# Altium footprint library sun_library.PcbLib: 412 footprints (part 23 of 26)
Each footprint in its own frame and in the unit in brackets; x right, y up, seen from the top. Pads: shape width x height; smd on the part's side, far side on the other; paste and mask are expansions set on the pad; w line width, h text height; cw(c..) or ccw(c..) is an arc to the next point about the centre after c.
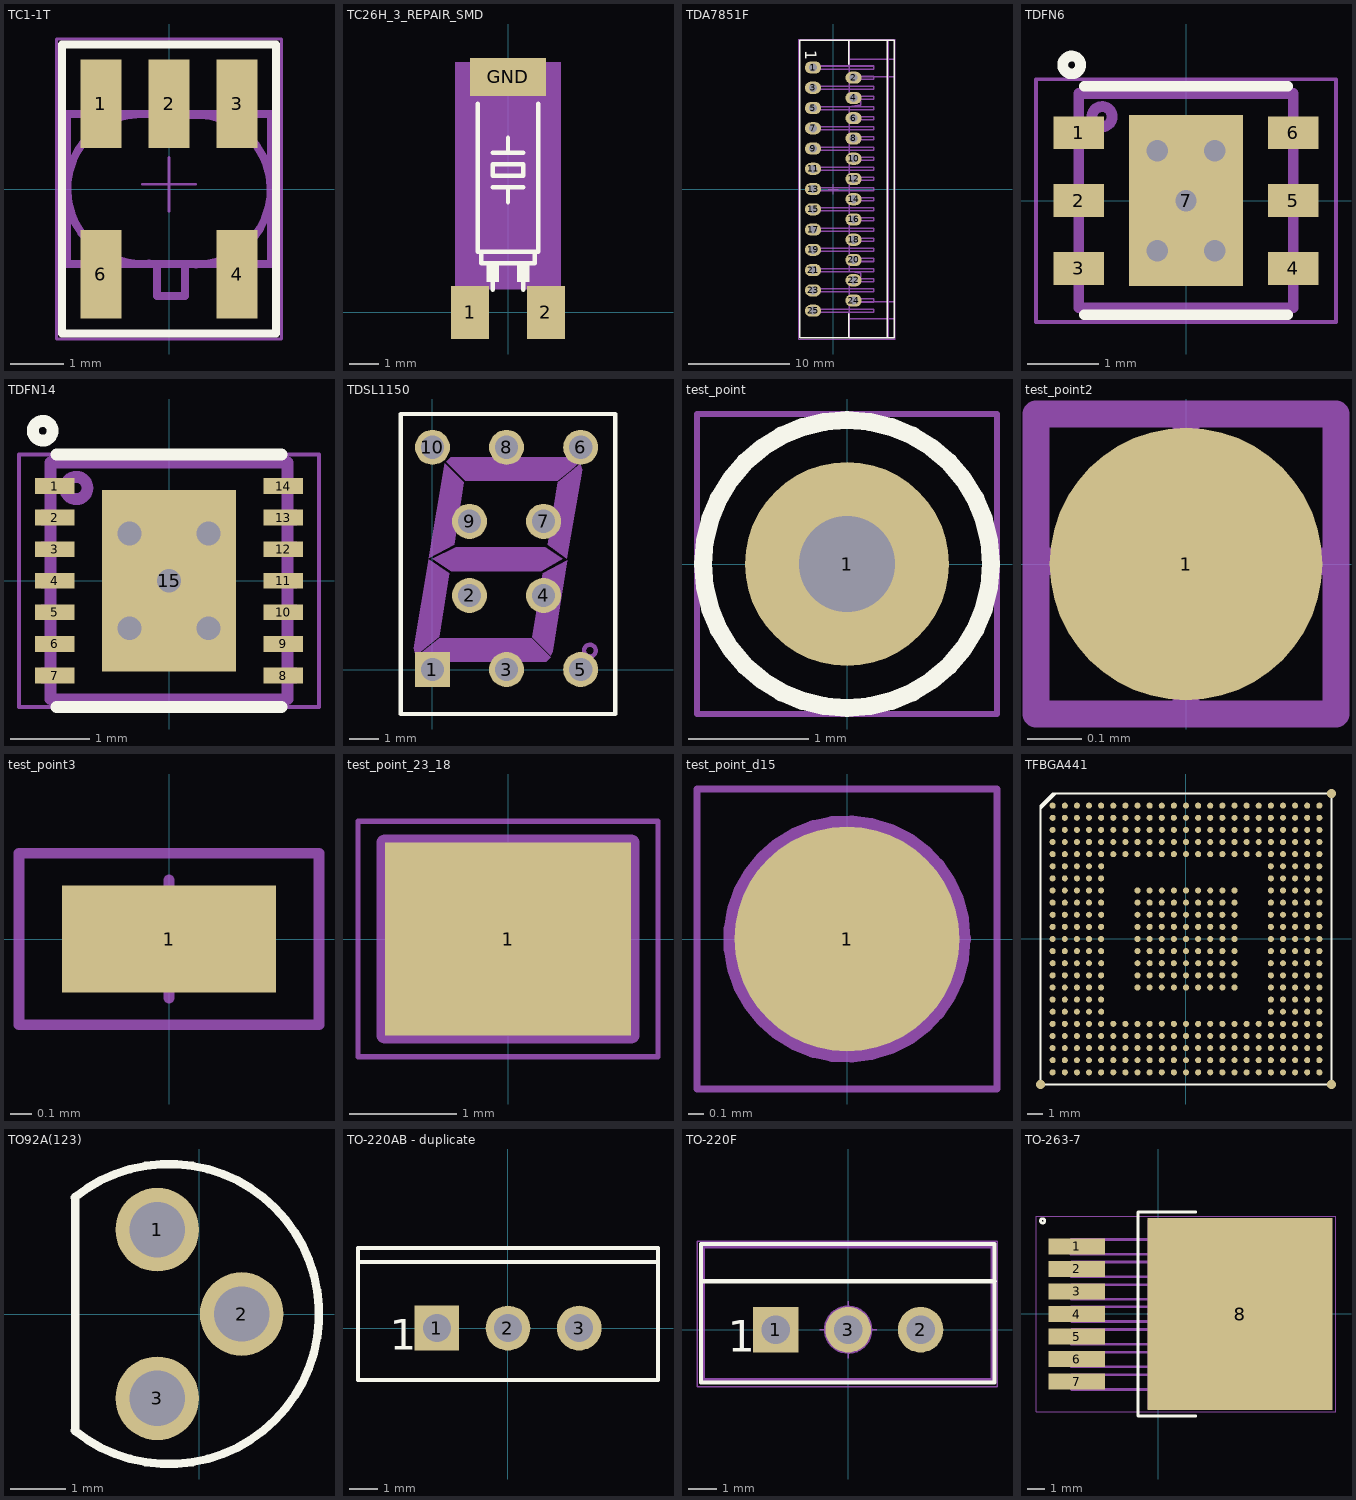
[diagram p22: the footprints below, top view; thin cyan lines are the x and y axes]

## TC1-1T [mm] "TC1-1T RF Transformer From MINI-CIRCUITS"
height 1.35
pads (5):
  rect 0.76x1.65 smd: 1(-1.27,1.59) 2(0,1.59) 3(1.27,1.59) 4(1.27,-1.59) 6(-1.27,-1.59)
Top Overlay:
  lines w0.15: -2,-2.7 2,-2.7 2,2.7 -2,2.7 -2,-2.7
TopAssy 13:
  lines w0.15: -0.5,1.4 ccw(c-0.5,0) -0.373,-1.394 ; -0.2,-1.4 0.325,-1.4 ; 0.373,1.382 cw(c0.5,-0.012) 0.5,-1.412 ; 1.9,-0.012 1.9,0.288 ; -0.3,1.4 -0.3,2 0.225,2 0.225,1.4 ; -0.3,1.4 -0.975,1.4 -0.975,2 -1.5,2 -1.5,1.4 -1.9,1.4 -1.9,-1.4 -1.525,-1.4 -1.525,-2 -1,-2 -1,-1.4 -0.225,-1.4 -0.225,-2 0.3,-2 0.3,-1.4 0.975,-1.4 0.975,-2 1.5,-2 1.5,-1.4 1.9,-1.4 1.9,1.4 1.525,1.4 1.525,2 1,2 1,1.4 0.225,1.4 ; -0.3,1.4 0.225,1.4
CourtTop 15:
  lines w0.05: -0.5,0.087 0.5,0.087 ; 0,-0.413 0,0.587 ; -2.1,-2.8 -2.1,2.8 2.1,2.8 2.1,-2.8 -2.1,-2.8
3D body "User Library-etc1-1-13.step": height 2.55, standoff -0.05, extent -1.91,-2.413 1.9,2.413

## TC26H_3_REPAIR_SMD [mil]
pads (3):
  rect 50x70 smd: 1(-50,0) 2(50,0)
  rect 100x50 smd: GND(0,310)
Top Overlay:
  rectangle: -28,40 -12,63
  rectangle: 12,40 28,63
  lines w5.91: -40,275 -40,80 -35,80 ; -20,30 -20,50 ; -20,165 0,165 ; -20,210 0,210 ; 0,145 0,165 ; 0,230 0,210 ; 20,30 20,45 ; 20,165 0,165 ; 20,210 0,210 ; 40,275 40,80 35,80 ; -35,80 35,80 ; -35,80 -35,65 35,65 35,80 ; -20,180 20,180 20,195 -20,195 -20,180
Mechanical 11:
  rectangle: -70,30 70,330

## TDA7851F [mm] "TO, Thru-Hole, 4 x 48 W MOSFET quad bridge power amplifier"
height 22
pads (25):
  oval 1.6x1.2 hole 0.8: 1(-2,12) 2(2,11) 3(-2,10) 4(2,9) 5(-2,8) 6(2,7) 7(-2,6) 8(2,5) 9(-2,4) 10(2,3) 11(-2,2) 12(2,1) 13(-2,0) 14(2,-1) 15(-2,-2) 16(2,-3) 17(-2,-4) 18(2,-5) 19(-2,-6) 20(2,-7) 21(-2,-8) 22(2,-9) 23(-2,-10) 24(2,-11) 25(-2,-12)
Top Overlay:
  lines w0.15: 1.5,-14.7 1.5,-12.3 ; 1.5,12.3 1.5,14.7 ; 5.3,-14.7 5.3,14.7 ; -3.3,-14.7 -3.3,14.7 6,14.7 6,-14.7 -3.3,-14.7
  text "1" at -2.775,13.715 h1.1
TopAssy 13:
  lines w0.15: -1.5,-12.15 -1.5,-11.85 ; -1.5,-10.15 -1.5,-9.85 ; -1.5,-8.15 -1.5,-7.85 ; -1.5,-6.15 -1.5,-5.85 ; -1.5,-4.15 -1.5,-3.85 ; -1.5,-2.15 -1.5,-1.85 ; -1.5,-0.15 -1.5,0.15 ; -1.5,1.85 -1.5,2.15 ; -1.5,3.85 -1.5,4.15 ; -1.5,5.85 -1.5,6.15 ; -1.5,7.85 -1.5,8.15 ; -1.5,9.85 -1.5,10.15 ; -1.5,11.85 -1.5,12.15 ; 1.55,-12.8 6.05,-12.8 ; 1.55,-11.1 6.05,-11.1 ; 1.55,11.1 6.05,11.1 ; 1.55,12.8 6.05,12.8 ; 2.5,-11.15 2.5,-10.85 ; 2.5,-9.15 2.5,-8.85 ; 2.5,-7.15 2.5,-6.85 ; 2.5,-5.15 2.5,-4.85 ; 2.5,-3.15 2.5,-2.85 ; 2.5,-1.15 2.5,-0.85 ; 2.5,0.85 2.5,1.15 ; 2.5,2.85 2.5,3.15 ; 2.5,4.85 2.5,5.15 ; 2.5,6.85 2.5,7.15 ; 2.5,8.85 2.5,9.15 ; 2.5,10.85 2.5,11.15 ; 5.4,-14.7 5.4,14.7 ; -2,-12.15 -2,-11.85 4,-11.85 4,-12.15 -2,-12.15 ; -2,-10.15 -2,-9.85 4,-9.85 4,-10.15 -2,-10.15 ; -2,-8.15 -2,-7.85 4,-7.85 4,-8.15 -2,-8.15 ; -2,-6.15 -2,-5.85 4,-5.85 4,-6.15 -2,-6.15 ; -2,-4.15 -2,-3.85 4,-3.85 4,-4.15 -2,-4.15 ; -2,-2.15 -2,-1.85 4,-1.85 4,-2.15 -2,-2.15 ; -2,-0.15 -2,0.15 4,0.15 4,-0.15 -2,-0.15 ; -2,1.85 -2,2.15 4,2.15 4,1.85 -2,1.85 ; -2,3.85 -2,4.15 4,4.15 4,3.85 -2,3.85 ; -2,5.85 -2,6.15 4,6.15 4,5.85 -2,5.85 ; -2,7.85 -2,8.15 4,8.15 4,7.85 -2,7.85 ; -2,9.85 -2,10.15 4,10.15 4,9.85 -2,9.85 ; -2,11.85 -2,12.15 4,12.15 4,11.85 -2,11.85 ; 1.55,-14.7 1.55,-8.864 2.7,-8.7 2.7,-8.3 1.55,-8.136 1.55,8.136 2.7,8.3 2.7,8.7 1.55,8.864 1.55,14.7 6.05,14.7 6.05,-14.7 1.55,-14.7 ; 2,-11.15 2,-10.85 4,-10.85 4,-11.15 2,-11.15 ; 2,-9.15 2,-8.85 4,-8.85 4,-9.15 2,-9.15 ; 2,-7.15 2,-6.85 4,-6.85 4,-7.15 2,-7.15 ; 2,-5.15 2,-4.85 4,-4.85 4,-5.15 2,-5.15 ; 2,-3.15 2,-2.85 4,-2.85 4,-3.15 2,-3.15 ; 2,-1.15 2,-0.85 4,-0.85 4,-1.15 2,-1.15 ; 2,0.85 2,1.15 4,1.15 4,0.85 2,0.85 ; 2,2.85 2,3.15 4,3.15 4,2.85 2,2.85 ; 2,4.85 2,5.15 4,5.15 4,4.85 2,4.85 ; 2,6.85 2,7.15 4,7.15 4,6.85 2,6.85 ; 2,8.85 2,9.15 4,9.15 4,8.85 2,8.85 ; 2,10.85 2,11.15 4,11.15 4,10.85 2,10.85
  text "1" at -2.775,13.715 h1.1
CourtTop 15:
  lines w0.05: -0.5,0 0.5,0 ; 0,-0.5 0,0.5 ; -3.4,-14.8 -3.4,14.8 6.1,14.8 6.1,-14.8 -3.4,-14.8
3D body "User Library-TDA7850-2.step": height 19.7, standoff -2.77, extent -2.195,-14.615 6,14.615

## TDFN6 [mm] "6-Pin Plastic Dual 3x3 Flat No-Lead 0.95 mm Pitch, IPC Low Density"
height 0.8
pads (7):
  rect 0.71x0.46 smd mask+0.075: 1(-1.5,0.95) 2(-1.5,0) 3(-1.5,-0.95) 4(1.5,-0.95) 5(1.5,0) 6(1.5,0.95)
  rect 1.6x2.39 smd paste-1 mask+0.075: 7(0,0)
via -0.4,-0.7 diameter 0.6 hole 0.3
via 0.4,-0.7 diameter 0.6 hole 0.3
via 0,0 diameter 0.6 hole 0.3
via -0.4,0.7 diameter 0.6 hole 0.3
via 0.4,0.7 diameter 0.6 hole 0.3
Top Overlay:
  circle w0.15: c-1.6,1.9 r0.125
  lines w0.15: -1.425,-1.6 1.425,-1.6 ; -1.425,1.6 1.425,1.6
Top Paste:
  rectangle: -0.325,0.5 0.3,1.125
  rectangle: -0.8,-0.3 -0.175,0.325
  rectangle: -0.3,-1.075 0.325,-0.45
  rectangle: 0.2,-0.325 0.825,0.3
Bottom Solder:
  rectangle: -0.9,-1.3 0.9,1.3
TopAssy 13:
  circle w0.15: c-1.175,1.175 r0.141
  lines w0.15: -1.6,-1.07 -1.6,-0.83 ; -1.6,-0.12 -1.6,0.12 ; -1.6,0.83 -1.6,1.07 ; 1.6,-1.07 1.6,-0.83 ; 1.6,-0.12 1.6,0.12 ; 1.6,0.83 1.6,1.07 ; -1.5,-1.5 1.5,-1.5 1.5,1.5 -1.5,1.5 -1.5,-1.5
CourtTop 15:
  lines w0.05: -0.5,0 0.5,0 ; 0,-0.5 0,-0.25 0,0.25 0,0.5 ; -2.1,-1.7 2.1,-1.7 2.1,1.7 -2.1,1.7 -2.1,-1.7
3D body "User Library-TDFN-6.step": height 0.75, standoff -0.03, extent -1.52,-1.5 1.52,1.5

## TDFN14 [mm] "14-Pin Plastic Dual 3x3 Flat No-Lead 0.4 mm Pitch, IPC Low Density"
height 0.8
pads (15):
  rect 0.5x0.2 smd mask+0.05: 1(-1.45,1.2) 2(-1.45,0.8) 3(-1.45,0.4) 4(-1.45,0) 5(-1.45,-0.4) 6(-1.45,-0.8) 7(-1.45,-1.2) 8(1.45,-1.2) 9(1.45,-0.8) 10(1.45,-0.4) 11(1.45,0) 12(1.45,0.4) 13(1.45,0.8) 14(1.45,1.2)
  rect 1.7x2.3 smd paste-1 mask+0.075: 15(0,0)
via 0,0 diameter 0.6 hole 0.3
via -0.5,0.6 diameter 0.6 hole 0.3
via 0.5,0.6 diameter 0.6 hole 0.3
via -0.5,-0.6 diameter 0.6 hole 0.3
via 0.5,-0.6 diameter 0.6 hole 0.3
Top Overlay:
  circle w0.15: c-1.6,1.9 r0.125
  lines w0.15: -1.425,-1.6 1.425,-1.6 ; -1.425,1.6 1.425,1.6
Top Paste:
  rectangle: 0.2,-0.325 0.825,0.3
  rectangle: -0.3,-1.075 0.325,-0.45
  rectangle: -0.8,-0.3 -0.175,0.325
  rectangle: -0.325,0.5 0.3,1.125
Bottom Solder:
  rectangle: -0.9,-1.2 0.9,1.2
TopAssy 13:
  circle w0.15: c-1.175,1.175 r0.141
  lines w0.15: -1.6,-1.225 -1.6,-1.175 ; -1.6,-0.825 -1.6,-0.775 ; -1.6,-0.425 -1.6,-0.375 ; -1.6,-0.025 -1.6,0.025 ; -1.6,0.375 -1.6,0.425 ; -1.6,0.775 -1.6,0.825 ; -1.6,1.175 -1.6,1.225 ; 1.6,-1.225 1.6,-1.175 ; 1.6,-0.825 1.6,-0.775 ; 1.6,-0.425 1.6,-0.375 ; 1.6,-0.025 1.6,0.025 ; 1.6,0.375 1.6,0.425 ; 1.6,0.775 1.6,0.825 ; 1.6,1.175 1.6,1.225 ; -1.5,-1.5 -1.5,1.5 1.5,1.5 1.5,-1.5 -1.5,-1.5
CourtTop 15:
  lines w0.05: -0.5,0 0.5,0 ; 0,-0.5 0,-0.25 0,0.25 0,0.5 ; -1.9,-1.6 -1.9,1.6 1.9,1.6 1.9,-1.6 -1.9,-1.6
3D body "User Library-TDFN-EP-14.step": height 0.73, standoff -0.03, extent -1.505,-1.5 1.505,1.5

## TDSL1150 [mm] "Семисегментный индикатор"
height 6
pads (10):
  rect 1.2x1.2 hole 0.8: 1(0,0)
  round 1.2 hole 0.8: 2(1.27,2.54) 3(2.54,0) 4(3.81,2.54) 5(5.08,0) 6(5.08,7.62) 7(3.81,5.08) 8(2.54,7.62) 9(1.27,5.08) 10(0,7.62)
Top Overlay:
  lines w0.15: -1.093,-1.524 -1.093,8.763 6.273,8.763 6.273,-1.524 -1.093,-1.524
CourtBot 16:
  circle w0.15: c5.398,0.65 r0.202
  region: 0.225,1.075 3.4,1.075 4.05,0.425 3.9,0.275 -0.25,0.275 -0.575,0.425 -0.2,0.725
  region: 0.8,4.2 3.875,4.2 4.475,3.8 3.725,3.375 0.65,3.375 0,3.8
  region: 4.3,6.475 1.125,6.475 0.475,7.125 0.625,7.275 4.775,7.275 5.05,7.1 4.725,6.825
  region: -0.65,0.725 -0.125,3.775 0.575,3.3 0.225,1.125 -0.575,0.475
  region: 5.138,6.85 4.613,3.8 3.95,4.275 4.3,6.425 5.063,7.063
  region: -0.125,3.825 0.425,7.075 1.075,6.425 0.75,4.275
  region: 4.625,3.75 4.125,0.625 4.05,0.475 3.425,1.1 3.775,3.3

## test_point [mm] "test_point"
pads (1):
  round 1.7 hole 0.8: 1(0,0)
Top Overlay:
  circle w0.15: c0,0 r1.2
TopAssy 13:
  lines w0.15: -0.5,-0.425 -0.5,0.375 0.275,0.375 0.275,-0.425 -0.5,-0.425
CourtTop 15:
  lines w0.05: -0.5,0.005 0.5,0.005 ; 0,-0.495 0,0.505 ; -1.25,-1.25 -1.25,1.25 1.25,1.25 1.25,-1.25 -1.25,-1.25

## test_point2 [mm] "test_point"
pads (1):
  round 0.5 smd mask+0.075: 1(0,0)
TopAssy 13:
  circle w0.15: c0,0 r0.125
CourtTop 15:
  lines w0.05: -0.275,0.005 0.275,0.005 ; 0,-0.275 0,0.275 ; -0.275,-0.275 0.275,-0.275 0.275,0.275 -0.275,0.275 -0.275,-0.275

## test_point3 [mm] "test_point"
pads (1):
  rect 1x0.5 smd mask+0.075: 1(0,0)
TopAssy 13:
  circle w0.15: c0,0 r0.125
CourtTop 15:
  lines w0.05: -0.275,0.005 0.275,0.005 ; 0,-0.275 0,0.275 ; -0.7,-0.4 -0.7,0.4 0.7,0.4 0.7,-0.4 -0.7,-0.4

## test_point_23_18 [mm] "test_point"
pads (1):
  rect 2.3x1.8 smd mask+0.075: 1(0,0)
TopAssy 13:
  lines w0.15: -1.15,-0.9 1.15,-0.9 1.15,0.9 -1.15,0.9 -1.15,-0.9
CourtTop 15:
  lines w0.05: -0.275,0.005 0.275,0.005 ; 0,-0.275 0,0.275 ; -1.4,-1.1 1.4,-1.1 1.4,1.1 -1.4,1.1 -1.4,-1.1

## test_point_d15 [mm] "test_point"
pads (1):
  round 1.5 smd mask+0.075: 1(0,0)
TopAssy 13:
  circle w0.15: c0,0 r0.75
CourtTop 15:
  lines w0.05: -0.275,0.005 0.275,0.005 ; 0,-0.275 0,0.275 ; -1,-1 -1,1 1,1 1,-1 -1,-1

## TFBGA441 [mm]
pads (444):
  round 0.4 smd mask+0.075: A1(-8.8,8.8) A2(-8,8.8) A3(-7.2,8.8) A4(-6.4,8.8) A5(-5.6,8.8) A6(-4.8,8.8) A7(-4,8.8) A8(-3.2,8.8) A9(-2.4,8.8) A10(-1.6,8.8) A11(-0.8,8.8) A12(0,8.8) A13(0.8,8.8) A14(1.6,8.8) A15(2.4,8.8) A16(3.2,8.8) A17(4,8.8) A18(4.8,8.8) A19(5.6,8.8) A20(6.4,8.8) A21(7.2,8.8) A22(8,8.8) A23(8.8,8.8) AA1(-8.8,-7.2) AA2(-8,-7.2) AA3(-7.2,-7.2) AA4(-6.4,-7.2) AA5(-5.6,-7.2) AA6(-4.8,-7.2) AA7(-4,-7.2) AA8(-3.2,-7.2) AA9(-2.4,-7.2) AA10(-1.6,-7.2) AA11(-0.8,-7.2) AA12(0,-7.2) AA13(0.8,-7.2) AA14(1.6,-7.2) AA15(2.4,-7.2) AA16(3.2,-7.2) AA17(4,-7.2) AA18(4.8,-7.2) AA19(5.6,-7.2) AA20(6.4,-7.2) AA21(7.2,-7.2) AA22(8,-7.2) AA23(8.8,-7.2) AB1(-8.8,-8) AB2(-8,-8) AB3(-7.2,-8) AB4(-6.4,-8) AB5(-5.6,-8) AB6(-4.8,-8) AB7(-4,-8) AB8(-3.2,-8) AB9(-2.4,-8) AB10(-1.6,-8) AB11(-0.8,-8) AB12(0,-8) AB13(0.8,-8) AB14(1.6,-8) AB15(2.4,-8) AB16(3.2,-8) AB17(4,-8) AB18(4.8,-8) AB19(5.6,-8) AB20(6.4,-8) AB21(7.2,-8) AB22(8,-8) AB23(8.8,-8) AC1(-8.8,-8.8) AC2(-8,-8.8) AC3(-7.2,-8.8) AC4(-6.4,-8.8) AC5(-5.6,-8.8) AC6(-4.8,-8.8) AC7(-4,-8.8) AC8(-3.2,-8.8) AC9(-2.4,-8.8) AC10(-1.6,-8.8) AC11(-0.8,-8.8) AC12(0,-8.8) AC13(0.8,-8.8) AC14(1.6,-8.8) AC15(2.4,-8.8) AC16(3.2,-8.8) AC17(4,-8.8) AC18(4.8,-8.8) AC19(5.6,-8.8) AC20(6.4,-8.8) AC21(7.2,-8.8) AC22(8,-8.8) AC23(8.8,-8.8) B1(-8.8,8) B2(-8,8) B3(-7.2,8) B4(-6.4,8) B5(-5.6,8) B6(-4.8,8) B7(-4,8) B8(-3.2,8) B9(-2.4,8) B10(-1.6,8) B11(-0.8,8) B12(0,8) B13(0.8,8) B14(1.6,8) B15(2.4,8) B16(3.2,8) B17(4,8) B18(4.8,8) B19(5.6,8) B20(6.4,8) B21(7.2,8) B22(8,8) B23(8.8,8) C1(-8.8,7.2) C2(-8,7.2) C3(-7.2,7.2) C4(-6.4,7.2) C5(-5.6,7.2) C6(-4.8,7.2) C7(-4,7.2) C8(-3.2,7.2) C9(-2.4,7.2) C10(-1.6,7.2) C11(-0.8,7.2) C12(0,7.2) C13(0.8,7.2) C14(1.6,7.2) C15(2.4,7.2) C16(3.2,7.2) C17(4,7.2) C18(4.8,7.2) C19(5.6,7.2) C20(6.4,7.2) C21(7.2,7.2) C22(8,7.2) C23(8.8,7.2) D1(-8.8,6.4) D2(-8,6.4) D3(-7.2,6.4) D4(-6.4,6.4) D5(-5.6,6.4) D6(-4.8,6.4) D7(-4,6.4) D8(-3.2,6.4) D9(-2.4,6.4) D10(-1.6,6.4) D11(-0.8,6.4) D12(0,6.4) D13(0.8,6.4) D14(1.6,6.4) D15(2.4,6.4) D16(3.2,6.4) D17(4,6.4) D18(4.8,6.4) D19(5.6,6.4) D20(6.4,6.4) D21(7.2,6.4) D22(8,6.4) D23(8.8,6.4) E1(-8.8,5.6) E2(-8,5.6) E3(-7.2,5.6) E4(-6.4,5.6) E5(-5.6,5.6) E6(-4.8,5.6) E7(-4,5.6) E8(-3.2,5.6) E9(-2.4,5.6) E10(-1.6,5.6) E11(-0.8,5.6) E12(0,5.6) E13(0.8,5.6) E14(1.6,5.6) E15(2.4,5.6) E16(3.2,5.6) E17(4,5.6) E18(4.8,5.6) E19(5.6,5.6) E20(6.4,5.6) E21(7.2,5.6) E22(8,5.6) E23(8.8,5.6) F1(-8.8,4.8) F2(-8,4.8) F3(-7.2,4.8) F4(-6.4,4.8) F5(-5.6,4.8) F19(5.6,4.8) F20(6.4,4.8) F21(7.2,4.8) F22(8,4.8) F23(8.8,4.8) G1(-8.8,4) G2(-8,4) G3(-7.2,4) G4(-6.4,4) G5(-5.6,4) G19(5.6,4) G20(6.4,4) G21(7.2,4) G22(8,4) G23(8.8,4) H1(-8.8,3.2) H2(-8,3.2) H3(-7.2,3.2) H4(-6.4,3.2) H5(-5.6,3.2) H8(-3.2,3.2) H9(-2.4,3.2) H10(-1.6,3.2) H11(-0.8,3.2) H12(0,3.2) H13(0.8,3.2) H14(1.6,3.2) H15(2.4,3.2) H16(3.2,3.2) H19(5.6,3.2) H20(6.4,3.2) H21(7.2,3.2) H22(8,3.2) H23(8.8,3.2) J1(-8.8,2.4) J2(-8,2.4) J3(-7.2,2.4) J4(-6.4,2.4) J5(-5.6,2.4) J8(-3.2,2.4) J9(-2.4,2.4) J10(-1.6,2.4) J11(-0.8,2.4) J12(0,2.4) J13(0.8,2.4) J14(1.6,2.4) J15(2.4,2.4) J16(3.2,2.4) J19(5.6,2.4) J20(6.4,2.4) J21(7.2,2.4) J22(8,2.4) J23(8.8,2.4) K1(-8.8,1.6) K2(-8,1.6) K3(-7.2,1.6) K4(-6.4,1.6) K5(-5.6,1.6) K8(-3.2,1.6) K9(-2.4,1.6) K10(-1.6,1.6) K11(-0.8,1.6) K12(0,1.6) K13(0.8,1.6) K14(1.6,1.6) K15(2.4,1.6) K16(3.2,1.6) K19(5.6,1.6) K20(6.4,1.6) K21(7.2,1.6) K22(8,1.6) K23(8.8,1.6) L1(-8.8,0.8) L2(-8,0.8) L3(-7.2,0.8) L4(-6.4,0.8) L5(-5.6,0.8) L8(-3.2,0.8) L9(-2.4,0.8) L10(-1.6,0.8) L11(-0.8,0.8) L12(0,0.8) L13(0.8,0.8) L14(1.6,0.8) L15(2.4,0.8) L16(3.2,0.8) L19(5.6,0.8) L20(6.4,0.8) L21(7.2,0.8) L22(8,0.8) L23(8.8,0.8) M1(-8.8,0) M2(-8,0) M3(-7.2,0) M4(-6.4,0) M5(-5.6,0) M8(-3.2,0) M9(-2.4,0) M10(-1.6,0) M11(-0.8,0) M12(0,0) M13(0.8,0) M14(1.6,0) M15(2.4,0) M16(3.2,0) M19(5.6,0) M20(6.4,0) M21(7.2,0) M22(8,0) M23(8.8,0) N1(-8.8,-0.8) N2(-8,-0.8) N3(-7.2,-0.8) N4(-6.4,-0.8) N5(-5.6,-0.8) N8(-3.2,-0.8) N9(-2.4,-0.8) N10(-1.6,-0.8) N11(-0.8,-0.8) N12(0,-0.8) N13(0.8,-0.8) N14(1.6,-0.8) N15(2.4,-0.8) N16(3.2,-0.8) N19(5.6,-0.8) N20(6.4,-0.8) N21(7.2,-0.8) N22(8,-0.8) N23(8.8,-0.8) P1(-8.8,-1.6) P2(-8,-1.6) P3(-7.2,-1.6) P4(-6.4,-1.6) P5(-5.6,-1.6) P8(-3.2,-1.6) P9(-2.4,-1.6) P10(-1.6,-1.6) P11(-0.8,-1.6) P12(0,-1.6) P13(0.8,-1.6) P14(1.6,-1.6) P15(2.4,-1.6) P16(3.2,-1.6) P19(5.6,-1.6) P20(6.4,-1.6) P21(7.2,-1.6) P22(8,-1.6) P23(8.8,-1.6) R1(-8.8,-2.4) R2(-8,-2.4) R3(-7.2,-2.4) R4(-6.4,-2.4) R5(-5.6,-2.4) R8(-3.2,-2.4) R9(-2.4,-2.4) R10(-1.6,-2.4) R11(-0.8,-2.4) R12(0,-2.4) R13(0.8,-2.4) R14(1.6,-2.4) R15(2.4,-2.4) R16(3.2,-2.4) R19(5.6,-2.4) R20(6.4,-2.4) R21(7.2,-2.4) R22(8,-2.4) R23(8.8,-2.4) T1(-8.8,-3.2) T2(-8,-3.2) T3(-7.2,-3.2) T4(-6.4,-3.2) T5(-5.6,-3.2) T8(-3.2,-3.2) T9(-2.4,-3.2) T10(-1.6,-3.2) T11(-0.8,-3.2) T12(0,-3.2) T13(0.8,-3.2) T14(1.6,-3.2) T15(2.4,-3.2) T16(3.2,-3.2) T19(5.6,-3.2) T20(6.4,-3.2) T21(7.2,-3.2) T22(8,-3.2) T23(8.8,-3.2) U1(-8.8,-4) U2(-8,-4) U3(-7.2,-4) U4(-6.4,-4) U5(-5.6,-4) U19(5.6,-4) U20(6.4,-4) U21(7.2,-4) U22(8,-4) U23(8.8,-4) V1(-8.8,-4.8) V2(-8,-4.8) V3(-7.2,-4.8) V4(-6.4,-4.8) V5(-5.6,-4.8) V19(5.6,-4.8) V20(6.4,-4.8) V21(7.2,-4.8) V22(8,-4.8) V23(8.8,-4.8) W1(-8.8,-5.6) W2(-8,-5.6) W3(-7.2,-5.6) W4(-6.4,-5.6) W5(-5.6,-5.6) W6(-4.8,-5.6) W7(-4,-5.6) W8(-3.2,-5.6) W9(-2.4,-5.6) W10(-1.6,-5.6) W11(-0.8,-5.6) W12(0,-5.6) W13(0.8,-5.6) W14(1.6,-5.6) W15(2.4,-5.6) W16(3.2,-5.6) W17(4,-5.6) W18(4.8,-5.6) W19(5.6,-5.6) W20(6.4,-5.6) W21(7.2,-5.6) W22(8,-5.6) W23(8.8,-5.6) Y1(-8.8,-6.4) Y2(-8,-6.4) Y3(-7.2,-6.4) Y4(-6.4,-6.4) Y5(-5.6,-6.4) Y6(-4.8,-6.4) Y7(-4,-6.4) Y8(-3.2,-6.4) Y9(-2.4,-6.4) Y10(-1.6,-6.4) Y11(-0.8,-6.4) Y12(0,-6.4) Y13(0.8,-6.4) Y14(1.6,-6.4) Y15(2.4,-6.4) Y16(3.2,-6.4) Y17(4,-6.4) Y18(4.8,-6.4) Y19(5.6,-6.4) Y20(6.4,-6.4) Y21(7.2,-6.4) Y22(8,-6.4) Y23(8.8,-6.4)
  round 0.6 smd mask+0.075: FID1(9.6,9.6) FID2(9.6,-9.6) FID3(-9.6,-9.6)
Top Overlay:
  lines w0.15: -9.6,8.6 -8.6,9.6 ; -9.6,8.6 -9.6,-9 -9.6,-9.6 -9,-9.6 9,-9.6 9.6,-9.6 9.6,-9 9.6,9 9.6,9.6 9,9.6 -8.6,9.6 ; -9.6,8.6 -9.6,8.8 -8.8,9.6 -8.6,9.6

## TO92A(123) [mm]
pads (3):
  round 1.51 hole 1: 1(-0.762,1.524) 2(0.762,0) 3(-0.762,-1.524)
Top Overlay:
  lines w0.15: -2.255,-2.106 ccw(c-0.55,0) -2.255,2.106 ; -2.244,-2.117 -2.244,2.117

## TO-220AB - duplicate [mm] "TO, Thru-Hole, Vertical, Heatsink Mounted; 3 In-Line Leads; Pitch 2.54 mm"
height 19.3
pads (3):
  rect 1.6x1.6 hole 1: 1(-2.54,0)
  round 1.6 hole 1: 2(0,0) 3(2.54,0)
Top Overlay:
  lines w0.15: -5.35,2.35 5.35,2.35 ; -5.35,-1.85 5.35,-1.85 5.35,2.85 -5.35,2.85 -5.35,-1.85
  text "1" at -4.215,-0.775 h1.1
3D body "User Library-IRFZ44V Transistors MOSFET N-Channel TO-220AB.step": height 19.37, standoff -13.52, extent -5.08,-1.505 5.08,2.7

## TO-220F [mm] "TO, Thru-Hole, Vertical, Heatsink Mounted; 3 In-Line Leads; Pitch 2.54 mm"
height 19.3
pads (3):
  rect 1.6x1.6 hole 1: 1(-2.54,0)
  round 1.6 hole 1: 2(2.54,0) 3(0,0)
Top Overlay:
  lines w0.15: -5.14,1.7 5.14,1.7 ; -5.157,-1.853 -5.157,3.002 5.133,3.002 5.133,-1.853 -5.157,-1.853
  text "1" at -4.215,-0.775 h1.1
TopAssy 13:
  circle w0.15: c0,0 r0.775
  circle w0.05: c-2.54,0 r0.5
  lines w0.15: -5.1,-1.775 -5.1,2.925 5.06,2.925 5.06,-1.775 -5.1,-1.775
CourtTop 15:
  circle w0.05: c0,0 r0.5
  lines w0.05: -1,0 1,0 ; 0,-1 0,1 ; -5.3,-2 -5.3,3.1 5.219,3.1 5.219,-2 -5.3,-2
3D body "User Library-Transistors TO-220F-3FS.step": height 19.87, standoff -8.98, extent -5.081,-1.775 5.06,2.925

## TO-263-7 [mm] "D2-PAK, 7-Leads, Body 9.3x10.2mm, Pitch 2.54mm, Lead Span 15.2mm, IPC Medium Density"
height 4.57
pads (8):
  rect 3.2x0.91 smd: 1(-4.6,3.81) 2(-4.6,2.54) 3(-4.6,1.27) 4(-4.6,0) 5(-4.6,-1.27) 6(-4.6,-2.54) 7(-4.6,-3.81)
  rect 10.41x10.8 smd: 8(4.6,0)
Top Overlay:
  circle w0.15: c-6.525,5.25 r0.125
  lines w0.15: 2.1,-5.75 -1.15,-5.75 -1.15,5.75 2.1,5.75
TopAssy 13:
  lines w0.15: -0.575,3.375 -4.925,3.375 -4.925,4.2 -0.575,4.2 ; -0.55,-4.25 -4.9,-4.25 -4.9,-3.425 -0.55,-3.425 ; -0.55,-2.975 -4.9,-2.975 -4.9,-2.15 -0.55,-2.15 ; -0.55,-1.7 -4.9,-1.7 -4.9,-0.875 -0.55,-0.875 ; -0.55,-0.425 -4.9,-0.425 -4.9,0.4 -0.55,0.4 ; -0.55,0.825 -4.9,0.825 -4.9,1.65 -0.55,1.65 ; -0.55,2.1 -4.9,2.1 -4.9,2.925 -0.55,2.925 ; 8.45,-5.3 9.5,-4.25 9.5,4.175 8.45,5.225 8.45,5.25 ; 8.45,-5.3 8.45,5.25 ; 8.45,-5.3 -0.55,-5.3 -0.55,5.25 8.45,5.25
CourtTop 15:
  lines w0.05: -0.5,0 0.5,0 ; -0.04,-0.5 -0.04,0.5 ; -6.9,-5.5 10,-5.5 10,5.5 -6.9,5.5 -6.9,-5.5
3D body "SW3dPS-TO263-7-1.STEP": height 4.78, standoff -0.02, extent -5.82,-5 9.85,5